# Altium footprint library ICs_rus.PCBLIB: 103 footprints (part 2 of 7)
Each footprint in its own frame and in the unit in brackets; x right, y up, seen from the top. Pads: shape width x height; smd on the part's side, far side on the other; paste and mask are expansions set on the pad; w line width, h text height; cw(c..) or ccw(c..) is an arc to the next point about the centre after c.
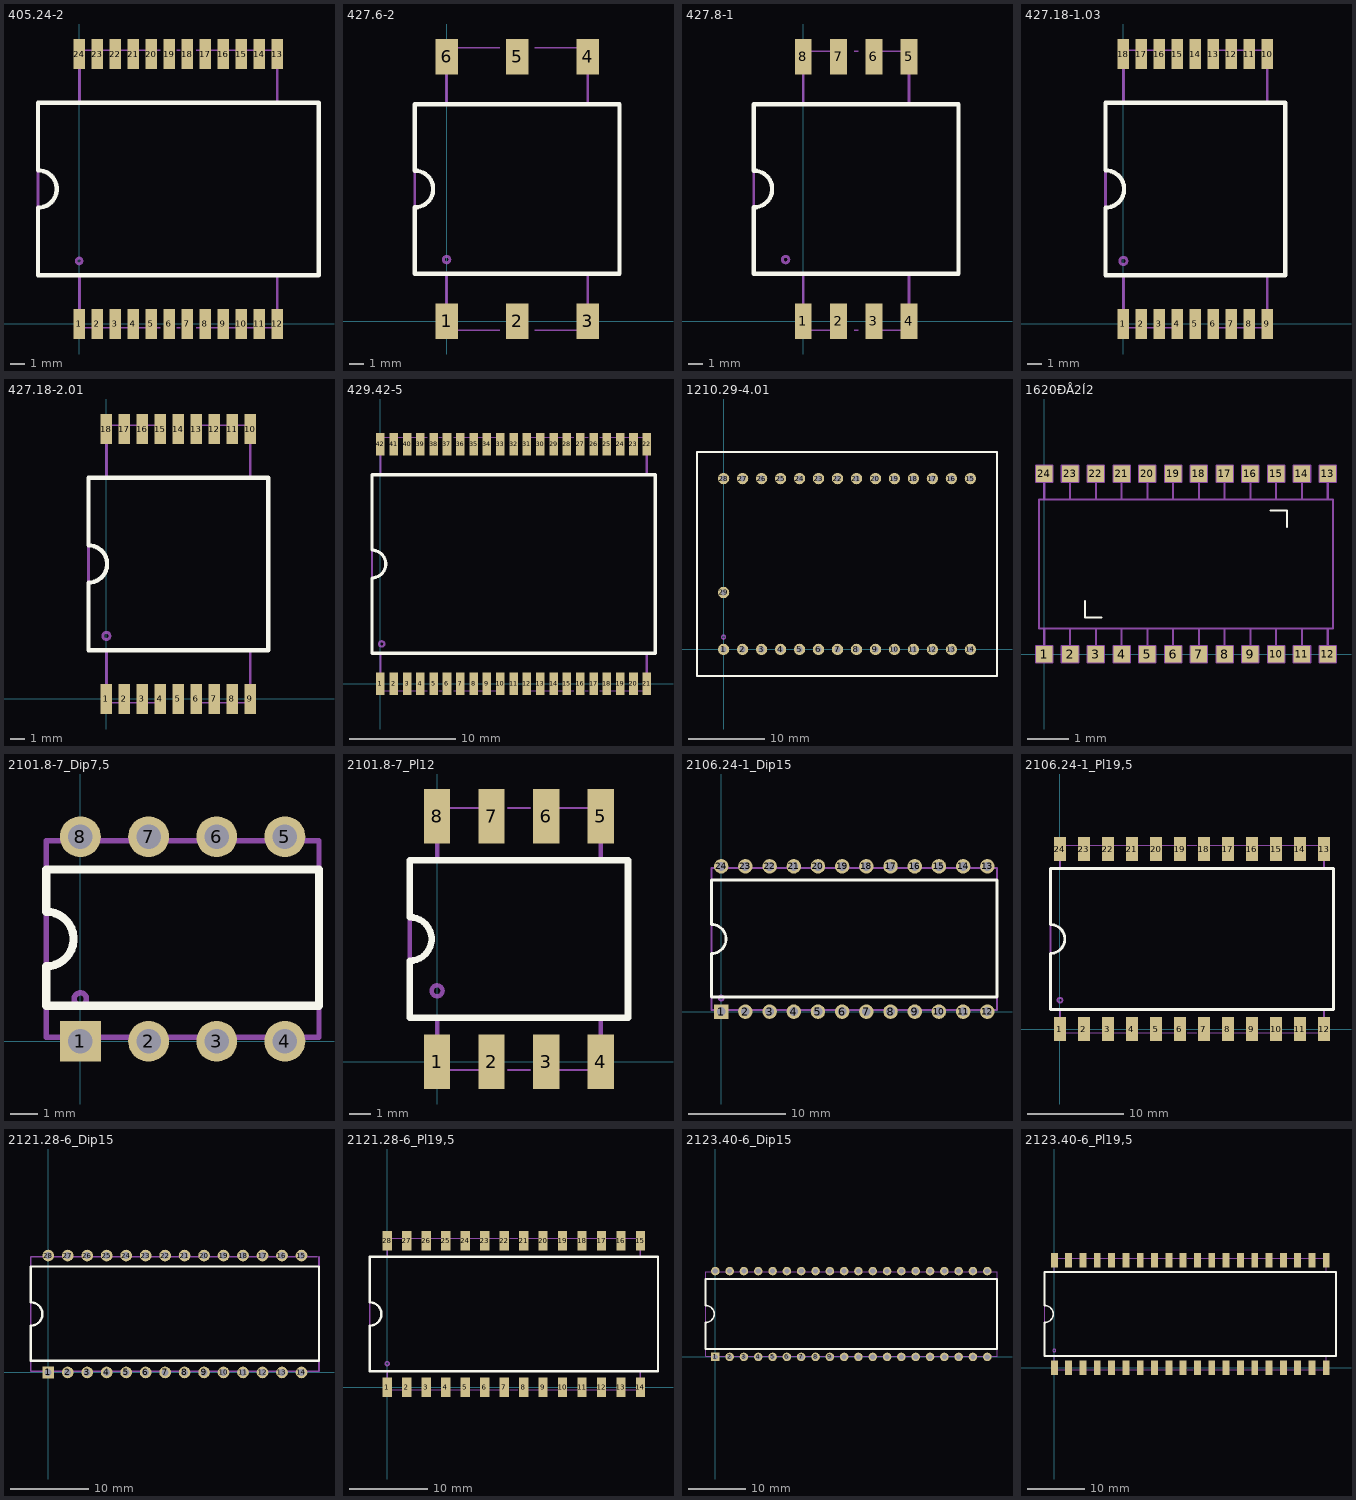
[diagram p1: the footprints below, top view; thin cyan lines are the x and y axes]

## 405.24-2 [mm]
pads (24):
  rect 0.8x2.1 smd: 1(0,0) 2(1.25,0) 3(2.5,0) 4(3.75,0) 5(5,0) 6(6.25,0) 7(7.5,0) 8(8.75,0) 9(10,0) 10(11.25,0) 11(12.5,0) 12(13.75,0) 13(13.75,18.75) 14(12.5,18.75) 15(11.25,18.75) 16(10,18.75) 17(8.75,18.75) 18(7.5,18.75) 19(6.25,18.75) 20(5,18.75) 21(3.75,18.75) 22(2.5,18.75) 23(1.25,18.75) 24(0,18.75)
Top Overlay:
  lines w0.3: -2.875,3.375 16.625,3.375 16.625,15.375 -2.875,15.375 -2.875,10.675 cw(c-2.875,9.375) -2.875,8.075 -2.875,3.4
Mechanical 1:
  circle w0.2: c-0.025,4.375 r0.2
  lines w0.1: 0,-0.275 5.625,-0.275 ; 0,19.025 5.625,19.025 ; 6.75,-0.275 7,-0.275 ; 6.75,19.025 7,19.025 ; 8.125,-0.275 13.75,-0.275 ; 8.125,19.025 13.75,19.025
  lines w0.2: 0,-0.275 0,3.35 ; 0,15.375 0,19.025 ; 13.75,-0.275 13.75,3.375 ; 13.75,15.4 13.75,19.025 ; -2.875,3.375 16.625,3.375 16.625,15.375 -2.875,15.375 -2.875,3.375
  text "24" at 0.751,16.243 h1.5
  text ".Comment" at 3.7,8.2 h1.5
  text ".Designator" at 5.6,10.3 h1.5
3D body: height 2.8, standoff 0, extent -2.9,-0.3 16.6,19

## 427.6-2 [mm]
pads (6):
  rect 1.6x2.5 smd: 1(0,0) 2(5,0) 3(10,0) 4(10,18.75) 5(5,18.75) 6(0,18.75)
Top Overlay:
  lines w0.3: -2.25,3.375 -2.25,8.075 ccw(c-2.25,9.375) -2.25,10.675 -2.25,15.375 12.25,15.375 12.25,3.375 -2.25,3.375
Mechanical 1:
  circle w0.2: c0,4.375 r0.23
  lines w0.1: 0,-0.625 3.75,-0.625 ; 0,19.375 3.75,19.375 ; 4.85,-0.625 5.15,-0.625 ; 4.85,19.4 5.15,19.4 ; 6.25,-0.625 10,-0.625 ; 6.25,19.375 10,19.375
  lines w0.2: 0,-0.625 0,3.375 ; 0,15.375 0,19.125 ; 10,-0.625 10,3.375 ; 10,15.375 10,19.125 ; -2.25,3.375 -2.25,15.375 12.25,15.375 12.25,3.375 -2.25,3.375
  text ".Designator" at 4.1,10 h1.5
  text ".Comment" at 2.2,7.9 h1.5
  text "6" at 1,16.9 h1.5
3D body: height 5, standoff 0, extent -2.3,-0.6 12.2,19.4

## 427.8-1 [mm]
pads (8):
  rect 1.2x2.5 smd: 1(0,0) 2(2.5,0) 3(5,0) 4(7.5,0) 5(7.5,18.75) 6(5,18.75) 7(2.5,18.75) 8(0,18.75)
Top Overlay:
  lines w0.3: -3.5,3.375 -3.5,8.075 ccw(c-3.5,9.375) -3.5,10.675 -3.5,15.375 11,15.375 11,3.375 -3.5,3.375
Mechanical 1:
  circle w0.2: c-1.25,4.375 r0.23
  lines w0.1: 0,-0.625 2.5,-0.625 ; 0,19.125 2.5,19.125 ; 3.6,-0.625 3.9,-0.625 ; 3.6,19.125 3.9,19.125 ; 5,-0.625 7.5,-0.625 ; 5,19.125 7.5,19.125
  lines w0.2: 0,-0.625 0,3.375 ; 0,15.375 0,19.125 ; 7.5,-0.625 7.5,3.375 ; 7.5,15.375 7.5,19.125 ; -3.5,3.375 -3.5,15.375 11,15.375 11,3.375 -3.5,3.375
  text "6" at 0.9,16.8 h1.5
  text ".Comment" at 0.4,8.2 h1.5
  text ".Designator" at 2.3,10.3 h1.5
3D body: height 5, standoff 0, extent -3.5,-0.7 11,19.3

## 427.18-1.03 [mm]
pads (18):
  rect 0.8x2.1 smd: 1(0,0) 2(1.25,0) 3(2.5,0) 4(3.75,0) 5(5,0) 6(6.25,0) 7(7.5,0) 8(8.75,0) 9(10,0) 10(10,18.75) 11(8.75,18.75) 12(7.5,18.75) 13(6.25,18.75) 14(5,18.75) 15(3.75,18.75) 16(2.5,18.75) 17(1.25,18.75) 18(0,18.75)
Top Overlay:
  lines w0.3: -1.25,3.375 11.25,3.375 11.25,15.375 -1.25,15.375 -1.25,10.675 cw(c-1.25,9.375) -1.25,8.075 -1.25,3.375
Mechanical 1:
  circle w0.2: c0,4.375 r0.25
  lines w0.1: 0,-0.275 3.75,-0.275 ; 0,19.025 3.75,19.025 ; 4.85,-0.275 5.15,-0.275 ; 4.85,19.025 5.15,19.025 ; 6.25,-0.275 10,-0.275 ; 6.25,19.025 10,19.025
  lines w0.2: 0,-0.275 0,3.375 ; 0,15.375 0,19.025 ; 10,-0.275 10,3.375 ; 10,15.375 10,19.025 ; -1.25,3.375 11.25,3.375 11.25,15.375 -1.25,15.375 -1.25,3.375
  text "18" at 0.8,16.4 h1.5
  text ".Comment" at 1.8,8.2 h1.5
  text ".Designator" at 3.7,10.3 h1.5
3D body: height 4.2, standoff 0, extent -1.3,-0.3 11.2,19

## 427.18-2.01 [mm]
pads (18):
  rect 0.8x2.1 smd: 1(0,0) 2(1.25,0) 3(2.5,0) 4(3.75,0) 5(5,0) 6(6.25,0) 7(7.5,0) 8(8.75,0) 9(10,0) 10(10,18.75) 11(8.75,18.75) 12(7.5,18.75) 13(6.25,18.75) 14(5,18.75) 15(3.75,18.75) 16(2.5,18.75) 17(1.25,18.75) 18(0,18.75)
Top Overlay:
  lines w0.3: -1.25,3.375 -1.25,8.075 ccw(c-1.25,9.375) -1.25,10.675 -1.25,15.375 11.25,15.375 11.25,3.375 -1.25,3.375
Mechanical 1:
  circle w0.2: c0,4.375 r0.25
  lines w0.1: 0,-0.275 3.75,-0.275 ; 0,19.025 3.75,19.025 ; 4.85,-0.275 5.15,-0.275 ; 4.85,19.025 5.15,19.025 ; 6.25,-0.275 10,-0.275 ; 6.25,19.025 10,19.025
  lines w0.2: 0,-0.275 0,3.375 ; 0,15.375 0,19.025 ; 10,-0.275 10,3.375 ; 10,15.375 10,19.025 ; -1.25,3.375 -1.25,15.375 11.25,15.375 11.25,3.375 -1.25,3.375
  text "18" at 0.7,16.5 h1.5
  text ".Comment" at 2,8 h1.5
  text ".Designator" at 3.9,10.1 h1.5
3D body: height 4.2, standoff 0, extent -1.3,-0.3 11.2,19

## 429.42-5 [mm]
pads (42):
  rect 0.8x2.1 smd: 1(0,0) 2(1.25,0) 3(2.5,0) 4(3.75,0) 5(5,0) 6(6.25,0) 7(7.5,0) 8(8.75,0) 9(10,0) 10(11.25,0) 11(12.5,0) 12(13.75,0) 13(15,0) 14(16.25,0) 15(17.5,0) 16(18.75,0) 17(20,0) 18(21.25,0) 19(22.5,0) 20(23.75,0) 21(25,0) 22(25,22.5) 23(23.75,22.5) 24(22.5,22.5) 25(21.25,22.5) 26(20,22.5) 27(18.75,22.5) 28(17.5,22.5) 29(16.25,22.5) 30(15,22.5) 31(13.75,22.5) 32(12.5,22.5) 33(11.25,22.5) 34(10,22.5) 35(8.75,22.5) 36(7.5,22.5) 37(6.25,22.5) 38(5,22.5) 39(3.75,22.5) 40(2.5,22.5) 41(1.25,22.5) 42(0,22.5)
Top Overlay:
  lines w0.3: -0.8,2.875 25.8,2.875 25.8,19.625 -0.8,19.625 -0.8,12.55 cw(c-0.8,11.25) -0.8,9.95 -0.8,2.875
Mechanical 1:
  circle w0.2: c0.125,3.75 r0.25
  lines w0.1: 0,-0.65 4.4,-0.65 ; 0,23.15 4.4,23.15 ; 5.5,-0.65 5.8,-0.65 ; 5.5,23.15 5.8,23.15 ; 6.875,-0.65 11.25,-0.65 ; 6.875,23.15 11.25,23.15 ; 12.35,-0.65 12.65,-0.65 ; 12.35,23.15 12.65,23.15 ; 13.75,-0.65 18.125,-0.65 ; 13.75,23.15 18.125,23.15 ; 19.2,-0.65 19.5,-0.65 ; 19.2,23.15 19.5,23.15 ; 20.6,-0.65 25,-0.65 ; 20.6,23.15 25,23.15
  lines w0.2: 0,-0.65 0,2.875 ; 0,19.625 0,23.15 ; 25,-0.65 25,2.875 ; 25,19.625 25,23.15 ; -0.8,2.875 25.8,2.875 25.8,19.622 -0.8,19.622 -0.8,2.875
  text ".Designator" at 10.5,12.6 h1.5
  text ".Comment" at 8.6,10.5 h1.5
  text "42" at 0.9,20.7 h1.5
3D body: height 3.2, standoff 0, extent -0.8,-0.7 25.82,23.1

## 1210.29-4.01 [mm]
pads (29):
  round 1.5 hole 0.8: 1(0,0) 2(2.5,0) 3(5,0) 4(7.5,0) 5(10,0) 6(12.5,0) 7(15,0) 8(17.5,0) 9(20,0) 10(22.5,0) 11(25,0) 12(27.5,0) 13(30,0) 14(32.5,0) 15(32.5,22.5) 16(30,22.5) 17(27.5,22.5) 18(25,22.5) 19(22.5,22.5) 20(20,22.5) 21(17.5,22.5) 22(15,22.5) 23(12.5,22.5) 24(10,22.5) 25(7.5,22.5) 26(5,22.5) 27(2.5,22.5) 28(0,22.5) 29(0,7.5)
Top Overlay:
  lines w0.3: -3.5,-3.5 36,-3.5 36,26 -3.5,26 -3.5,-3.5
Mechanical 1:
  circle w0.2: c0,1.625 r0.251
  lines w0.2: -3.5,-3.5 36,-3.5 36,26 -3.5,26 -3.5,-3.5
  text "15" at 31.376,19.368 h1.5
  text "14" at 31.376,0.618 h1.5
  text "28" at -1.124,19.368 h1.5
  text ".Designator" at 13.3,12.4 h1.5
  text ".Comment" at 11.4,10.3 h1.5

## 1620ÐÅ2Í2 [mm]
pads (24):
  rect 0.4x0.4 smd mask+0: 1(0,0) 2(0.625,0) 3(1.25,0) 4(1.875,0) 5(2.5,0) 6(3.125,0) 7(3.75,0) 8(4.375,0) 9(5,0) 10(5.625,0) 11(6.25,0) 12(6.875,0) 13(6.875,4.375) 14(6.25,4.375) 15(5.625,4.375) 16(5,4.375) 17(4.375,4.375) 18(3.75,4.375) 19(3.125,4.375) 20(2.5,4.375) 21(1.875,4.375) 22(1.25,4.375) 23(0.625,4.375) 24(0,4.375)
Top Overlay:
  lines w0.05: 0.987,1.287 0.987,0.887 1.387,0.887 ; 5.487,3.487 5.887,3.487 5.887,3.087
Mechanical 1:
  lines w0.05: 0,0.2 0,0.625 ; 0,3.75 0,4.17 ; 0.625,0.2 0.625,0.625 ; 0.625,3.75 0.625,4.17 ; 1.25,0.2 1.25,0.625 ; 1.25,3.75 1.25,4.17 ; 1.875,0.2 1.875,0.625 ; 1.875,3.75 1.875,4.17 ; 2.5,0.2 2.5,0.625 ; 2.5,3.75 2.5,4.17 ; 3.125,0.2 3.125,0.625 ; 3.125,3.75 3.125,4.17 ; 3.75,0.2 3.75,0.625 ; 3.75,3.75 3.75,4.17 ; 4.375,0.2 4.375,0.625 ; 4.375,3.75 4.375,4.17 ; 5,0.2 5,0.625 ; 5,3.75 5,4.17 ; 5.625,0.2 5.625,0.625 ; 5.625,3.75 5.625,4.17 ; 6.25,0.2 6.25,0.625 ; 6.25,3.75 6.25,4.17 ; 6.875,0.2 6.875,0.625 ; 6.875,3.75 6.875,4.17 ; -0.2,-0.2 0.2,-0.2 0.2,0.2 -0.2,0.2 -0.2,-0.2 ; -0.2,4.175 -0.2,4.575 0.2,4.575 0.2,4.175 -0.2,4.175 ; -0.125,0.625 -0.125,3.75 7,3.75 7,0.625 -0.125,0.625 ; 0.425,-0.2 0.825,-0.2 0.825,0.2 0.425,0.2 0.425,-0.2 ; 0.425,4.175 0.825,4.175 0.825,4.575 0.425,4.575 0.425,4.175 ; 1.05,-0.2 1.45,-0.2 1.45,0.2 1.05,0.2 1.05,-0.2 ; 1.05,4.175 1.45,4.175 1.45,4.575 1.05,4.575 1.05,4.175 ; 1.675,-0.2 2.075,-0.2 2.075,0.2 1.675,0.2 1.675,-0.2 ; 1.675,4.175 2.075,4.175 2.075,4.575 1.675,4.575 1.675,4.175 ; 2.3,-0.2 2.7,-0.2 2.7,0.2 2.3,0.2 2.3,-0.2 ; 2.3,4.175 2.7,4.175 2.7,4.575 2.3,4.575 2.3,4.175 ; 2.925,-0.2 3.325,-0.2 3.325,0.2 2.925,0.2 2.925,-0.2 ; 2.925,4.175 3.325,4.175 3.325,4.575 2.925,4.575 2.925,4.175 ; 3.55,-0.2 3.95,-0.2 3.95,0.2 3.55,0.2 3.55,-0.2 ; 3.55,4.175 3.95,4.175 3.95,4.575 3.55,4.575 3.55,4.175 ; 4.175,-0.2 4.575,-0.2 4.575,0.2 4.175,0.2 4.175,-0.2 ; 4.175,4.175 4.575,4.175 4.575,4.575 4.175,4.575 4.175,4.175 ; 4.8,-0.2 5.2,-0.2 5.2,0.2 4.8,0.2 4.8,-0.2 ; 4.8,4.175 5.2,4.175 5.2,4.575 4.8,4.575 4.8,4.175 ; 5.425,-0.2 5.825,-0.2 5.825,0.2 5.425,0.2 5.425,-0.2 ; 5.425,4.175 5.825,4.175 5.825,4.575 5.425,4.575 5.425,4.175 ; 6.05,-0.2 6.45,-0.2 6.45,0.2 6.05,0.2 6.05,-0.2 ; 6.05,4.175 6.45,4.175 6.45,4.575 6.05,4.575 6.05,4.175 ; 6.675,-0.2 7.075,-0.2 7.075,0.2 6.675,0.2 6.675,-0.2 ; 6.675,4.175 7.075,4.175 7.075,4.575 6.675,4.575 6.675,4.175
  text ".Designator" at 2.95,2.4 h0.6
  text ".Comment" at 2.6,1.6 h0.4
  text "24" at -0.15,4.275 h0.35
  text "23" at 0.475,4.275 h0.35
  text "22" at 1.1,4.275 h0.35
  text "21" at 1.725,4.275 h0.35
  text "20" at 2.35,4.275 h0.35
  text "19" at 2.975,4.275 h0.35
  text "18" at 3.6,4.275 h0.35
  text "17" at 4.225,4.275 h0.35
  text "16" at 4.875,4.275 h0.35
  text "15" at 5.5,4.275 h0.35
  text "14" at 6.125,4.275 h0.35
  text "13" at 6.75,4.275 h0.35
  text "12" at 6.725,-0.1 h0.35
  text "11" at 6.1,-0.1 h0.35
  text "10" at 5.475,-0.1 h0.35
  text "1" at -0.05,-0.1 h0.35
  text "2" at 0.575,-0.1 h0.35
  text "3" at 1.2,-0.1 h0.35
  text "4" at 1.825,-0.1 h0.35
  text "5" at 2.45,-0.1 h0.35
  text "6" at 3.075,-0.1 h0.35
  text "7" at 3.7,-0.1 h0.35
  text "8" at 4.325,-0.1 h0.35
  text "9" at 4.95,-0.1 h0.35

## 2101.8-7_Dip7,5 [mm]
pads (8):
  rect 1.5x1.5 hole 0.9: 1(0,0)
  round 1.5 hole 0.9: 2(2.5,0) 3(5,0) 4(7.5,0) 5(7.5,7.5) 6(5,7.5) 7(2.5,7.5) 8(0,7.5)
Top Overlay:
  lines w0.3: -1.25,1.3 8.75,1.3 8.75,6.3 -1.25,6.3 -1.25,4.75 cw(c-1.25,3.75) -1.25,2.75 -1.25,1.3
Mechanical 1:
  circle w0.2: c0,1.55 r0.225
  lines w0.2: -1.25,0.15 8.75,0.15 8.75,7.35 -1.25,7.35 -1.25,0.15
  text "8" at -0.254,5.461 h1.5
  text ".Comment" at 1.1,2.5 h1.5
  text ".Designator" at 3,4.6 h1.5

## 2101.8-7_Pl12 [mm]
pads (8):
  rect 1.2x2.5 smd: 1(0,0) 2(2.5,0) 3(5,0) 4(7.5,0) 5(7.5,11.25) 6(5,11.25) 7(2.5,11.25) 8(0,11.25)
Top Overlay:
  lines w0.3: -1.25,2.025 8.75,2.025 8.75,9.225 -1.25,9.225 -1.25,6.625 cw(c-1.25,5.625) -1.25,4.625 -1.25,2.025
Mechanical 1:
  circle w0.2: c0,3.25 r0.251
  lines w0.1: 0,-0.375 2.75,-0.375 ; 0,11.625 2.75,11.625 ; 3.25,-0.375 4.25,-0.375 ; 3.25,11.625 4.25,11.625 ; 4.75,-0.375 7.5,-0.375 ; 4.75,11.625 7.5,11.625
  lines w0.2: 0,-0.375 0,1.975 ; 0,9.275 0,11.625 ; 7.5,-0.375 7.5,1.975 ; 7.5,9.275 7.5,11.625 ; -1.25,2.025 8.75,2.025 8.75,9.225 -1.25,9.225 -1.25,2.025
  text "8" at 0.762,10.16 h1.5
  text ".Comment" at 1.2,4.6 h1.5
  text ".Designator" at 3.1,6.7 h1.5

## 2106.24-1_Dip15 [mm]
pads (24):
  rect 1.5x1.5 hole 0.9: 1(0,0)
  round 1.5 hole 0.9: 2(2.5,0) 3(5,0) 4(7.5,0) 5(10,0) 6(12.5,0) 7(15,0) 8(17.5,0) 9(20,0) 10(22.5,0) 11(25,0) 12(27.5,0) 13(27.5,15) 14(25,15) 15(22.5,15) 16(20,15) 17(17.5,15) 18(15,15) 19(12.5,15) 20(10,15) 21(7.5,15) 22(5,15) 23(2.5,15) 24(0,15)
Top Overlay:
  lines w0.3: -1,1.5 28.5,1.5 28.5,13.6 -1,13.6 -1,9 cw(c-1,7.5) -1,6 -1,1.5
Mechanical 1:
  circle w0.2: c0,1.4 r0.251
  lines w0.2: -1,0.15 28.5,0.15 28.5,14.85 -1,14.85 -1,0.15
  text ".Designator" at 11.9,8.3 h1.5
  text ".Comment" at 10,6.2 h1.5
  text "24" at -0.1,12.7 h1.5
3D body: height 5.93, standoff -3, extent -1,-0.2 28.5,15.1

## 2106.24-1_Pl19,5 [mm]
pads (24):
  rect 1.2x2.5 smd: 1(0,0) 2(2.5,0) 3(5,0) 4(7.5,0) 5(10,0) 6(12.5,0) 7(15,0) 8(17.5,0) 9(20,0) 10(22.5,0) 11(25,0) 12(27.5,0) 13(27.5,18.75) 14(25,18.75) 15(22.5,18.75) 16(20,18.75) 17(17.5,18.75) 18(15,18.75) 19(12.5,18.75) 20(10,18.75) 21(7.5,18.75) 22(5,18.75) 23(2.5,18.75) 24(0,18.75)
Top Overlay:
  lines w0.3: -1,2.025 -1,7.875 ccw(c-1,9.375) -1,10.875 -1,16.725 28.5,16.725 28.5,2.025 -1,2.025
Mechanical 1:
  circle w0.2: c0,3 r0.251
  lines w0.1: 0,-0.375 12.5,-0.375 ; 0,19.125 12.5,19.125 ; 13.25,-0.375 14.25,-0.375 ; 13.25,19.125 14.25,19.125 ; 15,-0.375 27.5,-0.375 ; 15,19.125 27.5,19.125
  lines w0.2: 0,-0.375 0,2.025 ; 0,16.725 0,19.125 ; 27.5,-0.375 27.5,2.025 ; 27.5,16.725 27.5,19.125 ; -1,2.025 -1,16.725 28.5,16.725 28.5,2.025 -1,2.025
  text ".Designator" at 12.6,10.2 h1.5
  text ".Comment" at 10.7,8.1 h1.5
  text "24" at 0,14.8 h1.5
3D body: height 3.3, standoff 0, extent -1,-0.4 28.5,19.1

## 2121.28-6_Dip15 [mm]
pads (28):
  rect 1.5x1.5 hole 0.9: 1(0,0)
  round 1.5 hole 0.9: 2(2.5,0) 3(5,0) 4(7.5,0) 5(10,0) 6(12.5,0) 7(15,0) 8(17.5,0) 9(20,0) 10(22.5,0) 11(25,0) 12(27.5,0) 13(30,0) 14(32.5,0) 15(32.5,15) 16(30,15) 17(27.5,15) 18(25,15) 19(22.5,15) 20(20,15) 21(17.5,15) 22(15,15) 23(12.5,15) 24(10,15) 25(7.5,15) 26(5,15) 27(2.5,15) 28(0,15)
Top Overlay:
  lines w0.3: -2.25,1.5 34.75,1.5 34.75,13.6 -2.25,13.6 -2.25,9 cw(c-2.25,7.5) -2.25,6 -2.25,1.5
Mechanical 1:
  lines w0.2: 34.5,14.85 -2.25,14.85 -2.25,0.15 34.75,0.15 34.75,14.85
  text ".Comment" at 12,6.3 h1.5
  text ".Designator" at 13.9,8.4 h1.5
  text "28" at -0.6,12.8 h1.5
3D body: height 6, standoff -3, extent -2,-0.1 34.5,15.2

## 2121.28-6_Pl19,5 [mm]
pads (28):
  rect 1.2x2.5 smd: 1(0,0) 2(2.5,0) 3(5,0) 4(7.5,0) 5(10,0) 6(12.5,0) 7(15,0) 8(17.5,0) 9(20,0) 10(22.5,0) 11(25,0) 12(27.5,0) 13(30,0) 14(32.5,0) 15(32.5,18.75) 16(30,18.75) 17(27.5,18.75) 18(25,18.75) 19(22.5,18.75) 20(20,18.75) 21(17.5,18.75) 22(15,18.75) 23(12.5,18.75) 24(10,18.75) 25(7.5,18.75) 26(5,18.75) 27(2.5,18.75) 28(0,18.75)
Top Overlay:
  lines w0.3: -2.25,2.025 -2.25,7.875 ccw(c-2.25,9.375) -2.25,10.875 -2.25,16.725 34.75,16.725 34.75,2.025 -2.25,2.025
Mechanical 1:
  circle w0.2: c0,3 r0.251
  lines w0.1: 0,-0.375 15,-0.375 ; 0,19.125 15,19.125 ; 15.75,-0.375 16.75,-0.375 ; 15.75,19.125 16.75,19.125 ; 17.5,-0.375 32.5,-0.375 ; 17.5,19.125 32.5,19.125
  lines w0.2: 0,-0.375 0,2.025 ; 0,16.725 0,19.125 ; 32.5,-0.375 32.5,2.025 ; 32.5,16.725 32.5,19.125 ; -2.25,2.025 -2.25,16.725 34.75,16.725 34.75,2.025 -2.25,2.025
  text ".Designator" at 14.9,10.2 h1.5
  text ".Comment" at 13,8.1 h1.5
  text "28" at 0.126,16.868 h1.5
3D body: height 3.3, standoff 0, extent -2,-0.4 34.5,19.1

## 2123.40-6_Dip15 [mm]
pads (40):
  rect 1.5x1.5 hole 0.9: 1(0,0)
  round 1.5 hole 0.9: 2(2.5,0) 3(5,0) 4(7.5,0) 5(10,0) 6(12.5,0) 7(15,0) 8(17.5,0) 9(20,0) 10(22.5,0) 11(25,0) 12(27.5,0) 13(30,0) 14(32.5,0) 15(35,0) 16(37.5,0) 17(40,0) 18(42.5,0) 19(45,0) 20(47.5,0) 21(47.5,15) 22(45,15) 23(42.5,15) 24(40,15) 25(37.5,15) 26(35,15) 27(32.5,15) 28(30,15) 29(27.5,15) 30(25,15) 31(22.5,15) 32(20,15) 33(17.5,15) 34(15,15) 35(12.5,15) 36(10,15) 37(7.5,15) 38(5,15) 39(2.5,15) 40(0,15)
Top Overlay:
  lines w0.3: -1.7,1.4 -1.7,6 ccw(c-1.7,7.5) -1.7,9 -1.7,13.6 49.2,13.6 49.2,1.4 -1.7,1.4
Mechanical 1:
  lines w0.2: -1.7,0.15 -1.7,14.85 49.2,14.85 49.2,0.15 -1.7,0.15
  text "40" at -1.124,11.868 h1.5
  text ".Comment" at 18.4,6 h1.5
  text ".Designator" at 20.3,8.1 h1.5
3D body: height 6, standoff -3, extent -1.7,-0.2 49.2,15.1

## 2123.40-6_Pl19,5 [mm]
pads (40):
  rect 1.2x2.5 smd: 1(0,0) 2(2.5,0) 3(5,0) 4(7.5,0) 5(10,0) 6(12.5,0) 7(15,0) 8(17.5,0) 9(20,0) 10(22.5,0) 11(25,0) 12(27.5,0) 13(30,0) 14(32.5,0) 15(35,0) 16(37.5,0) 17(40,0) 18(42.5,0) 19(45,0) 20(47.5,0) 21(47.5,18.75) 22(45,18.75) 23(42.5,18.75) 24(40,18.75) 25(37.5,18.75) 26(35,18.75) 27(32.5,18.75) 28(30,18.75) 29(27.5,18.75) 30(25,18.75) 31(22.5,18.75) 32(20,18.75) 33(17.5,18.75) 34(15,18.75) 35(12.5,18.75) 36(10,18.75) 37(7.5,18.75) 38(5,18.75) 39(2.5,18.75) 40(0,18.75)
Top Overlay:
  lines w0.3: -1.7,2.025 -1.7,7.875 ccw(c-1.7,9.375) -1.7,10.875 -1.7,16.725 49.2,16.725 49.2,2.025 -1.7,2.025
Mechanical 1:
  circle w0.2: c0,3 r0.251
  lines w0.1: 0,-0.375 22.5,-0.375 ; 0,19.125 22.5,19.125 ; 23.25,-0.375 24.25,-0.375 ; 23.25,19.125 24.25,19.125 ; 25,-0.375 47.55,-0.375 ; 25,19.125 47.5,19.125
  lines w0.2: 0,-0.375 0,2.025 ; 0,16.725 0,19.125 ; 47.5,-0.375 47.5,2.025 ; 47.5,16.725 47.5,19.125 ; -1.7,2.025 -1.7,16.725 49.2,16.725 49.2,2.025 -1.7,2.025
  text ".Designator" at 21.5,10.4 h1.5
  text ".Comment" at 19.6,8.3 h1.5
  text "40" at 0.126,16.868 h2.12
3D body: height 3.3, standoff 0, extent -1.7,-0.4 49.2,19.1